# Altium footprint library B-NT_CONNECT.PcbLib: 109 footprints (part 5 of 7)
Each footprint in its own frame and in the unit in brackets; x right, y up, seen from the top. Pads: shape width x height; smd on the part's side, far side on the other; paste and mask are expansions set on the pad; w line width, h text height; cw(c..) or ccw(c..) is an arc to the next point about the centre after c.
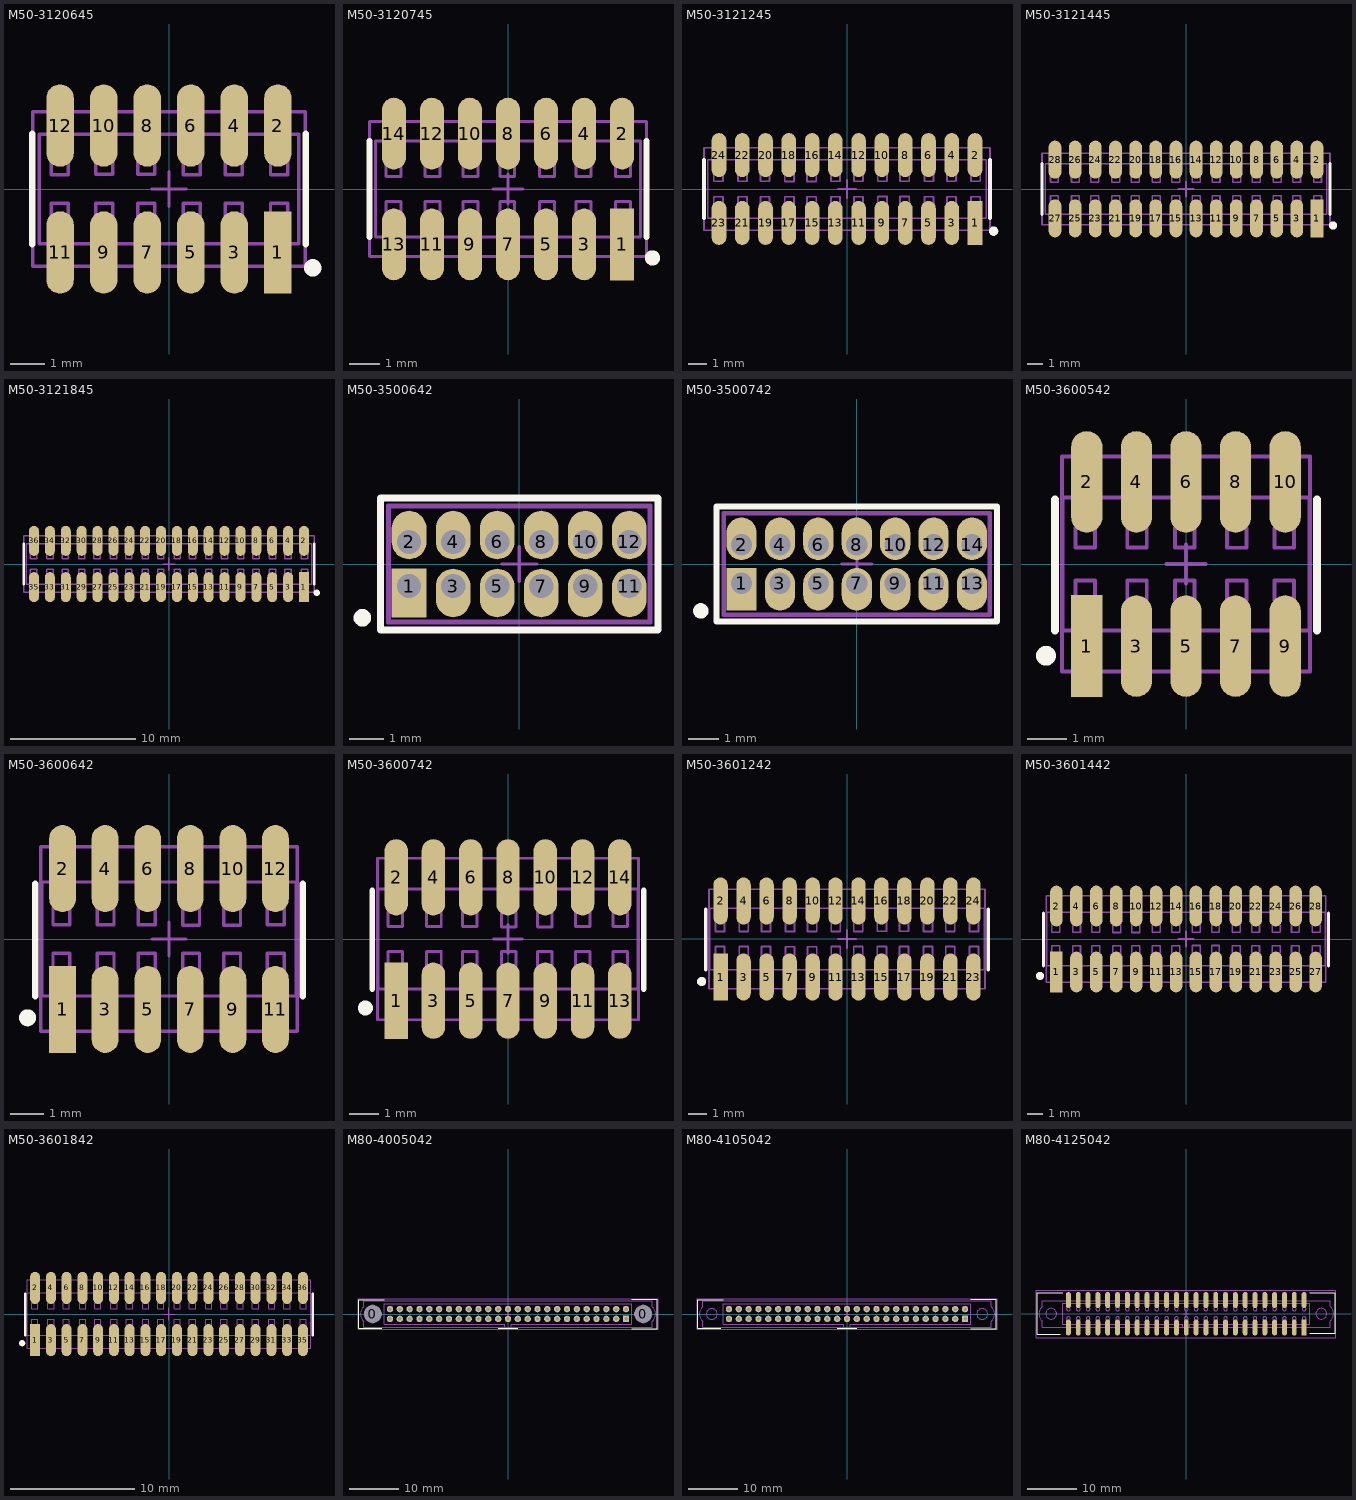
[diagram p4: the footprints below, top view; thin cyan lines are the x and y axes]

## M50-3120645 [mm]
height 3.6
pads (12):
  rect 0.8x2.4 smd: 1(3.175,-1.85)
  oval 0.8x2.4 smd: 2(3.175,1.85) 3(1.905,-1.85) 4(1.905,1.85) 5(0.635,-1.85) 6(0.635,1.85) 7(-0.635,-1.85) 8(-0.635,1.85) 9(-1.905,-1.85) 10(-1.905,1.85) 11(-3.175,-1.85) 12(-3.175,1.85)
Top Overlay:
  circle w0.254: c4.19,-2.3 r0.127
  lines w0.2: -3.99,-1.6 -3.99,1.6 ; 3.99,-1.6 3.99,1.6
M3 Top Assy:
  lines w0.1: -3.375,-1.615 -3.375,-2.37 -2.975,-2.37 -2.975,-1.615 ; -3.375,1.615 -3.375,2.37 -2.975,2.37 -2.975,1.615 ; -2.105,-1.615 -2.105,-2.37 -1.705,-2.37 -1.705,-1.615 ; -2.105,1.615 -2.105,2.37 -1.705,2.37 -1.705,1.615 ; -0.835,-1.615 -0.835,-2.37 -0.435,-2.37 -0.435,-1.615 ; -0.835,1.615 -0.835,2.37 -0.435,2.37 -0.435,1.615 ; 0.435,-1.615 0.435,-2.37 0.835,-2.37 0.835,-1.615 ; 0.435,1.615 0.435,2.37 0.835,2.37 0.835,1.615 ; 1.695,-1.62 1.695,-2.375 2.095,-2.375 2.095,-1.62 ; 1.695,1.62 1.695,2.375 2.095,2.375 2.095,1.62 ; 2.975,-1.615 2.975,-2.37 3.375,-2.37 3.375,-1.615 ; 2.975,1.615 2.975,2.37 3.375,2.37 3.375,1.615 ; -3.79,-1.6 -3.79,1.6 3.79,1.6 3.79,-1.6 -3.79,-1.6 ; -3.435,-0.92 -2.935,-0.92 -2.935,-0.42 -3.435,-0.42 -3.435,-0.92 ; -3.435,0.42 -3.435,0.92 -2.935,0.92 -2.935,0.42 -3.435,0.42 ; -2.135,-0.915 -2.135,-0.415 -1.635,-0.415 -1.635,-0.915 -2.135,-0.915 ; -2.135,0.425 -1.635,0.425 -1.635,0.925 -2.135,0.925 -2.135,0.425 ; -0.91,-0.915 -0.91,-0.415 -0.41,-0.415 -0.41,-0.915 -0.91,-0.915 ; -0.91,0.425 -0.41,0.425 -0.41,0.925 -0.91,0.925 -0.91,0.425 ; 0.415,-0.92 0.415,-0.42 0.915,-0.42 0.915,-0.92 0.415,-0.92 ; 0.415,0.42 0.915,0.42 0.915,0.92 0.415,0.92 0.415,0.42 ; 1.64,-0.92 1.64,-0.42 2.14,-0.42 2.14,-0.92 1.64,-0.92 ; 1.64,0.42 2.14,0.42 2.14,0.92 1.64,0.92 1.64,0.42 ; 2.96,-0.92 2.96,-0.42 3.46,-0.42 3.46,-0.92 2.96,-0.92 ; 2.96,0.42 3.46,0.42 3.46,0.92 2.96,0.92 2.96,0.42
M8 Top Brd Anno:
  lines w0.1: -0.5,0 0.5,0 ; 0,-0.5 0,0.5 ; -3.975,-2.25 3.975,-2.25 3.975,2.25 -3.7,2.25 -3.975,2.25 -3.975,-2.25
3D body "m50-3120645_asm.stp": height 3.5, standoff -0.1, extent -3.985,-2.25 3.985,2.25

## M50-3120745 [mm]
height 3.6
pads (14):
  rect 0.8x2.4 smd: 1(3.81,-1.85)
  oval 0.8x2.4 smd: 2(3.81,1.85) 3(2.54,-1.85) 4(2.54,1.85) 5(1.27,-1.85) 6(1.27,1.85) 7(0,-1.85) 8(0,1.85) 9(-1.27,-1.85) 10(-1.27,1.85) 11(-2.54,-1.85) 12(-2.54,1.85) 13(-3.81,-1.85) 14(-3.81,1.85)
Top Overlay:
  circle w0.254: c4.825,-2.3 r0.127
  lines w0.2: -4.625,-1.6 -4.625,1.6 ; 4.625,-1.6 4.625,1.6
M3 Top Assy:
  lines w0.1: -4.01,-1.615 -4.01,-2.37 -3.61,-2.37 -3.61,-1.615 ; -4.01,1.615 -4.01,2.37 -3.61,2.37 -3.61,1.615 ; -2.74,-1.615 -2.74,-2.37 -2.34,-2.37 -2.34,-1.615 ; -2.74,1.615 -2.74,2.37 -2.34,2.37 -2.34,1.615 ; -1.47,-1.615 -1.47,-2.37 -1.07,-2.37 -1.07,-1.615 ; -1.47,1.615 -1.47,2.37 -1.07,2.37 -1.07,1.615 ; -0.2,-1.615 -0.2,-2.37 0.2,-2.37 0.2,-1.615 ; -0.2,1.615 -0.2,2.37 0.2,2.37 0.2,1.615 ; 1.07,-1.615 1.07,-2.37 1.47,-2.37 1.47,-1.615 ; 1.07,1.615 1.07,2.37 1.47,2.37 1.47,1.615 ; 2.33,-1.62 2.33,-2.375 2.73,-2.375 2.73,-1.62 ; 2.33,1.62 2.33,2.375 2.73,2.375 2.73,1.62 ; 3.61,-1.615 3.61,-2.37 4.01,-2.37 4.01,-1.615 ; 3.61,1.615 3.61,2.37 4.01,2.37 4.01,1.615 ; -4.425,-1.6 4.425,-1.6 4.425,1.6 -4.425,1.6 -4.425,-1.6 ; -4.07,-0.92 -4.07,-0.42 -3.57,-0.42 -3.57,-0.92 -4.07,-0.92 ; -4.07,0.42 -3.57,0.42 -3.57,0.92 -4.07,0.92 -4.07,0.42 ; -2.77,-0.915 -2.77,-0.415 -2.27,-0.415 -2.27,-0.915 -2.77,-0.915 ; -2.77,0.425 -2.27,0.425 -2.27,0.925 -2.77,0.925 -2.77,0.425 ; -1.5,-0.915 -1,-0.915 -1,-0.415 -1.5,-0.415 -1.5,-0.915 ; -1.5,0.425 -1.5,0.925 -1,0.925 -1,0.425 -1.5,0.425 ; -0.275,-0.915 0.225,-0.915 0.225,-0.415 -0.275,-0.415 -0.275,-0.915 ; -0.275,0.425 -0.275,0.925 0.225,0.925 0.225,0.425 -0.275,0.425 ; 1.05,-0.92 1.55,-0.92 1.55,-0.42 1.05,-0.42 1.05,-0.92 ; 1.05,0.42 1.05,0.92 1.55,0.92 1.55,0.42 1.05,0.42 ; 2.275,-0.92 2.775,-0.92 2.775,-0.42 2.275,-0.42 2.275,-0.92 ; 2.275,0.42 2.275,0.92 2.775,0.92 2.775,0.42 2.275,0.42 ; 3.595,-0.92 4.095,-0.92 4.095,-0.42 3.595,-0.42 3.595,-0.92 ; 3.595,0.42 3.595,0.92 4.095,0.92 4.095,0.42 3.595,0.42
M8 Top Brd Anno:
  lines w0.1: -0.5,0 0.5,0 ; 0,-0.5 0,0.5 ; -4.625,-2.25 4.625,-2.25 4.625,2.25 -4.625,2.25 -4.625,-2.25
3D body "m50-3120745_asm.stp": height 3.5, standoff -0.1, extent -4.62,-2.25 4.62,2.25

## M50-3121245 [mm]
height 3.6
pads (24):
  rect 0.8x2.4 smd: 1(6.985,-1.85)
  oval 0.8x2.4 smd: 2(6.985,1.85) 3(5.715,-1.85) 4(5.715,1.85) 5(4.445,-1.85) 6(4.445,1.85) 7(3.175,-1.85) 8(3.175,1.85) 9(1.905,-1.85) 10(1.905,1.85) 11(0.635,-1.85) 12(0.635,1.85) 13(-0.635,-1.85) 14(-0.635,1.85) 15(-1.905,-1.85) 16(-1.905,1.85) 17(-3.175,-1.85) 18(-3.175,1.85) 19(-4.445,-1.85) 20(-4.445,1.85) 21(-5.715,-1.85) 22(-5.715,1.85) 23(-6.985,-1.85) 24(-6.985,1.85)
Top Overlay:
  circle w0.254: c8,-2.3 r0.127
  lines w0.2: -7.8,-1.6 -7.8,1.6 ; 7.8,-1.6 7.8,1.6
M3 Top Assy:
  drawing of 172 lines, arcs and shapes, not listed
M8 Top Brd Anno:
  lines w0.1: -0.5,0 0.5,0 ; 0,-0.5 0,0.5 ; -7.8,-2.25 7.8,-2.25 7.8,2.25 -7.8,2.25 -7.8,-2.25
3D body "m50-3121245_asm.stp": height 3.5, standoff -0.1, extent -7.795,-2.25 7.795,2.25

## M50-3121445 [mm]
height 3.6
pads (28):
  rect 0.8x2.4 smd: 1(8.255,-1.85)
  oval 0.8x2.4 smd: 2(8.255,1.85) 3(6.985,-1.85) 4(6.985,1.85) 5(5.715,-1.85) 6(5.715,1.85) 7(4.445,-1.85) 8(4.445,1.85) 9(3.175,-1.85) 10(3.175,1.85) 11(1.905,-1.85) 12(1.905,1.85) 13(0.635,-1.85) 14(0.635,1.85) 15(-0.635,-1.85) 16(-0.635,1.85) 17(-1.905,-1.85) 18(-1.905,1.85) 19(-3.175,-1.85) 20(-3.175,1.85) 21(-4.445,-1.85) 22(-4.445,1.85) 23(-5.715,-1.85) 24(-5.715,1.85) 25(-6.985,-1.85) 26(-6.985,1.85) 27(-8.255,-1.85) 28(-8.255,1.85)
Top Overlay:
  circle w0.254: c9.27,-2.3 r0.127
  lines w0.2: -9.07,-1.6 -9.07,1.6 ; 9.07,-1.6 9.07,1.6
M3 Top Assy:
  drawing of 200 lines, arcs and shapes, not listed
M8 Top Brd Anno:
  lines w0.1: -0.5,0 0.5,0 ; 0,-0.5 0,0.5 ; -9.075,-2.25 9.075,-2.25 9.075,2.25 -9.075,2.25 -9.075,-2.25
3D body "m50-3121445_asm.stp": height 3.5, standoff -0.1, extent -9.065,-2.25 9.065,2.25

## M50-3121845 [mm]
height 3.6
pads (36):
  rect 0.8x2.4 smd: 1(10.795,-1.85)
  oval 0.8x2.4 smd: 2(10.795,1.85) 3(9.525,-1.85) 4(9.525,1.85) 5(8.255,-1.85) 6(8.255,1.85) 7(6.985,-1.85) 8(6.985,1.85) 9(5.715,-1.85) 10(5.715,1.85) 11(4.445,-1.85) 12(4.445,1.85) 13(3.175,-1.85) 14(3.175,1.85) 15(1.905,-1.85) 16(1.905,1.85) 17(0.635,-1.85) 18(0.635,1.85) 19(-0.635,-1.85) 20(-0.635,1.85) 21(-1.905,-1.85) 22(-1.905,1.85) 23(-3.175,-1.85) 24(-3.175,1.85) 25(-4.445,-1.85) 26(-4.445,1.85) 27(-5.715,-1.85) 28(-5.715,1.85) 29(-6.985,-1.85) 30(-6.985,1.85) 31(-8.255,-1.85) 32(-8.255,1.85) 33(-9.525,-1.85) 34(-9.525,1.85) 35(-10.795,-1.85) 36(-10.795,1.85)
Top Overlay:
  circle w0.254: c11.81,-2.3 r0.127
  lines w0.2: -11.61,-1.6 -11.61,1.6 ; 11.61,-1.6 11.61,1.6
M3 Top Assy:
  drawing of 256 lines, arcs and shapes, not listed
M8 Top Brd Anno:
  lines w0.1: -0.5,0 0.5,0 ; 0,-0.5 0,0.5 ; -11.6,-2.25 11.6,-2.25 11.6,2.25 -11.6,2.25 -11.6,-2.25
3D body "m50-3121845_asm.stp": height 3.5, standoff -0.1, extent -11.605,-2.25 11.605,2.25

## M50-3500642 [mm]
pads (12):
  rect 1x1.4 hole 0.7 copper offset 0,-0.2: 1(-3.175,-0.635)
  oval 1x1.4 hole 0.7 copper offset 0,0.2: 2(-3.175,0.635) 4(-1.905,0.635) 6(-0.635,0.635) 8(0.635,0.635) 10(1.905,0.635) 12(3.175,0.635)
  oval 1x1.4 hole 0.7 copper offset 0,-0.2: 3(-1.905,-0.635) 5(-0.635,-0.635) 7(0.635,-0.635) 9(1.905,-0.635) 11(3.175,-0.635)
Top Overlay:
  circle w0.254: c-4.52,-1.55 r0.127
  lines w0.2: -4,-1.9 4,-1.9 4,1.9 -4,1.9 -4,-1.9
M3 Top Assy:
  lines w0.1: -3.79,-1.7 -3.79,1.7 3.79,1.7 3.79,-1.7 -3.79,-1.7 ; -3.46,-0.92 -2.96,-0.92 -2.96,-0.42 -3.46,-0.42 -3.46,-0.92 ; -3.46,0.42 -3.46,0.92 -2.96,0.92 -2.96,0.42 -3.46,0.42 ; -2.14,-0.92 -1.64,-0.92 -1.64,-0.42 -2.14,-0.42 -2.14,-0.92 ; -2.14,0.42 -2.14,0.92 -1.64,0.92 -1.64,0.42 -2.14,0.42 ; -0.915,-0.92 -0.415,-0.92 -0.415,-0.42 -0.915,-0.42 -0.915,-0.92 ; -0.915,0.42 -0.915,0.92 -0.415,0.92 -0.415,0.42 -0.915,0.42 ; 0.41,-0.925 0.91,-0.925 0.91,-0.425 0.41,-0.425 0.41,-0.925 ; 0.41,0.415 0.41,0.915 0.91,0.915 0.91,0.415 0.41,0.415 ; 1.635,-0.925 2.135,-0.925 2.135,-0.425 1.635,-0.425 1.635,-0.925 ; 1.635,0.415 1.635,0.915 2.135,0.915 2.135,0.415 1.635,0.415 ; 2.935,-0.92 2.935,-0.42 3.435,-0.42 3.435,-0.92 2.935,-0.92 ; 2.935,0.42 3.435,0.42 3.435,0.92 2.935,0.92 2.935,0.42
M8 Top Brd Anno:
  lines w0.1: -3.75,1.625 -3.725,1.65 3.75,1.65 3.75,-1.65 -3.75,-1.65 -3.75,1.65 ; -0.5,0 0.5,0 ; 0,-0.5 0,0.5
3D body "m50-3500642_asm.stp": height 3.97, standoff -2.33, extent -3.81,-1.7 3.81,1.7

## M50-3500742 [mm]
pads (14):
  rect 1x1.4 hole 0.7 copper offset 0,-0.2: 1(-3.81,-0.635)
  oval 1x1.4 hole 0.7 copper offset 0,0.2: 2(-3.81,0.635) 4(-2.54,0.635) 6(-1.27,0.635) 8(0,0.635) 10(1.27,0.635) 12(2.54,0.635) 14(3.81,0.635)
  oval 1x1.4 hole 0.7 copper offset 0,-0.2: 3(-2.54,-0.635) 5(-1.27,-0.635) 7(0,-0.635) 9(1.27,-0.635) 11(2.54,-0.635) 13(3.81,-0.635)
Top Overlay:
  circle w0.254: c-5.155,-1.55 r0.127
  lines w0.2: -4.635,-1.9 4.635,-1.9 4.635,1.9 -4.635,1.9 -4.635,-1.9
M3 Top Assy:
  lines w0.1: -4.425,-1.7 -4.425,1.7 4.425,1.7 4.425,-1.7 -4.425,-1.7 ; -4.095,-0.92 -3.595,-0.92 -3.595,-0.42 -4.095,-0.42 -4.095,-0.92 ; -4.095,0.42 -4.095,0.92 -3.595,0.92 -3.595,0.42 -4.095,0.42 ; -2.775,-0.92 -2.275,-0.92 -2.275,-0.42 -2.775,-0.42 -2.775,-0.92 ; -2.775,0.42 -2.775,0.92 -2.275,0.92 -2.275,0.42 -2.775,0.42 ; -1.55,-0.92 -1.05,-0.92 -1.05,-0.42 -1.55,-0.42 -1.55,-0.92 ; -1.55,0.42 -1.55,0.92 -1.05,0.92 -1.05,0.42 -1.55,0.42 ; -0.225,-0.925 0.275,-0.925 0.275,-0.425 -0.225,-0.425 -0.225,-0.925 ; -0.225,0.415 -0.225,0.915 0.275,0.915 0.275,0.415 -0.225,0.415 ; 1,-0.925 1.5,-0.925 1.5,-0.425 1,-0.425 1,-0.925 ; 1,0.415 1,0.915 1.5,0.915 1.5,0.415 1,0.415 ; 2.27,-0.925 2.27,-0.425 2.77,-0.425 2.77,-0.925 2.27,-0.925 ; 2.27,0.415 2.77,0.415 2.77,0.915 2.27,0.915 2.27,0.415 ; 3.57,-0.92 3.57,-0.42 4.07,-0.42 4.07,-0.92 3.57,-0.92 ; 3.57,0.42 4.07,0.42 4.07,0.92 3.57,0.92 3.57,0.42
M8 Top Brd Anno:
  lines w0.1: -0.5,0 0.5,0 ; 0,-0.5 0,0.5 ; -4.375,-1.65 4.375,-1.65 4.375,1.65 -4.375,1.65 -4.375,-1.65
3D body "m50-3500742_asm.stp": height 3.97, standoff -2.33, extent -4.445,-1.7 4.445,1.7

## M50-3600542 [mm]
pads (10):
  rect 0.8x2.6 smd: 1(-2.54,-2.1)
  oval 0.8x2.6 smd: 2(-2.54,2.1) 3(-1.27,-2.1) 4(-1.27,2.1) 5(0,-2.1) 6(0,2.1) 7(1.27,-2.1) 8(1.27,2.1) 9(2.54,-2.1) 10(2.54,2.1)
Top Overlay:
  circle w0.254: c-3.585,-2.35 r0.127
  lines w0.2: -3.355,-1.7 -3.355,1.65 ; 3.355,-1.7 3.355,1.65
M3 Top Assy:
  lines w0.1: -2.74,-1.715 -2.74,-2.47 -2.34,-2.47 -2.34,-1.715 ; -2.74,1.715 -2.74,2.47 -2.34,2.47 -2.34,1.715 ; -1.47,-1.715 -1.47,-2.47 -1.07,-2.47 -1.07,-1.715 ; -1.47,1.715 -1.47,2.47 -1.07,2.47 -1.07,1.715 ; -0.2,-1.715 -0.2,-2.47 0.2,-2.47 0.2,-1.715 ; -0.2,1.715 -0.2,2.47 0.2,2.47 0.2,1.715 ; 1.06,-1.72 1.06,-2.475 1.46,-2.475 1.46,-1.72 ; 1.06,1.72 1.06,2.475 1.46,2.475 1.46,1.72 ; 2.34,-1.715 2.34,-2.47 2.74,-2.47 2.74,-1.715 ; 2.34,1.715 2.34,2.47 2.74,2.47 2.74,1.715 ; -3.155,-1.7 3.155,-1.7 3.155,1.7 -3.155,1.7 -3.155,-1.7 ; -2.825,-0.92 -2.825,-0.42 -2.325,-0.42 -2.325,-0.92 -2.825,-0.92 ; -2.825,0.42 -2.325,0.42 -2.325,0.92 -2.825,0.92 -2.825,0.42 ; -1.505,-0.92 -1.505,-0.42 -1.005,-0.42 -1.005,-0.92 -1.505,-0.92 ; -1.505,0.42 -1.005,0.42 -1.005,0.92 -1.505,0.92 -1.505,0.42 ; -0.28,-0.92 -0.28,-0.42 0.22,-0.42 0.22,-0.92 -0.28,-0.92 ; -0.28,0.42 0.22,0.42 0.22,0.92 -0.28,0.92 -0.28,0.42 ; 1.045,-0.925 1.045,-0.425 1.545,-0.425 1.545,-0.925 1.045,-0.925 ; 1.045,0.415 1.545,0.415 1.545,0.915 1.045,0.915 1.045,0.415 ; 2.27,-0.925 2.27,-0.425 2.77,-0.425 2.77,-0.925 2.27,-0.925 ; 2.27,0.415 2.77,0.415 2.77,0.915 2.27,0.915 2.27,0.415
M8 Top Brd Anno:
  lines w0.1: -0.5,0 0.5,0 ; 0,-0.5 0,0.5 ; -3.175,-2.75 3.175,-2.75 3.175,2.75 -3.175,2.75 -3.175,-2.75
3D body "m50-3600542_asm.stp": height 4.6, standoff -0.08, extent -3.175,-2.75 3.175,2.75

## M50-3600642 [mm]
pads (12):
  rect 0.8x2.6 smd: 1(-3.175,-2.1)
  oval 0.8x2.6 smd: 2(-3.175,2.1) 3(-1.905,-2.1) 4(-1.905,2.1) 5(-0.635,-2.1) 6(-0.635,2.1) 7(0.635,-2.1) 8(0.635,2.1) 9(1.905,-2.1) 10(1.905,2.1) 11(3.175,-2.1) 12(3.175,2.1)
Top Overlay:
  circle w0.254: c-4.22,-2.35 r0.127
  lines w0.2: -3.99,-1.7 -3.99,1.65 ; 3.99,-1.7 3.99,1.65
M3 Top Assy:
  lines w0.1: -3.375,-1.715 -3.375,-2.47 -2.975,-2.47 -2.975,-1.715 ; -3.375,1.715 -3.375,2.47 -2.975,2.47 -2.975,1.715 ; -2.105,-1.715 -2.105,-2.47 -1.705,-2.47 -1.705,-1.715 ; -2.105,1.715 -2.105,2.47 -1.705,2.47 -1.705,1.715 ; -0.835,-1.715 -0.835,-2.47 -0.435,-2.47 -0.435,-1.715 ; -0.835,1.715 -0.835,2.47 -0.435,2.47 -0.435,1.715 ; 0.425,-1.72 0.425,-2.475 0.825,-2.475 0.825,-1.72 ; 0.425,1.72 0.425,2.475 0.825,2.475 0.825,1.72 ; 1.705,-1.715 1.705,-2.47 2.105,-2.47 2.105,-1.715 ; 1.705,1.715 1.705,2.47 2.105,2.47 2.105,1.715 ; 2.975,-1.715 2.975,-2.47 3.375,-2.47 3.375,-1.715 ; 2.975,1.715 2.975,2.47 3.375,2.47 3.375,1.715 ; -3.79,-1.7 3.79,-1.7 3.79,1.7 -3.79,1.7 -3.79,-1.7 ; -3.46,-0.92 -3.46,-0.42 -2.96,-0.42 -2.96,-0.92 -3.46,-0.92 ; -3.46,0.42 -2.96,0.42 -2.96,0.92 -3.46,0.92 -3.46,0.42 ; -2.14,-0.92 -2.14,-0.42 -1.64,-0.42 -1.64,-0.92 -2.14,-0.92 ; -2.14,0.42 -1.64,0.42 -1.64,0.92 -2.14,0.92 -2.14,0.42 ; -0.915,-0.92 -0.915,-0.42 -0.415,-0.42 -0.415,-0.92 -0.915,-0.92 ; -0.915,0.42 -0.415,0.42 -0.415,0.92 -0.915,0.92 -0.915,0.42 ; 0.41,-0.925 0.41,-0.425 0.91,-0.425 0.91,-0.925 0.41,-0.925 ; 0.41,0.415 0.91,0.415 0.91,0.915 0.41,0.915 0.41,0.415 ; 1.635,-0.925 1.635,-0.425 2.135,-0.425 2.135,-0.925 1.635,-0.925 ; 1.635,0.415 2.135,0.415 2.135,0.915 1.635,0.915 1.635,0.415 ; 2.935,-0.92 3.435,-0.92 3.435,-0.42 2.935,-0.42 2.935,-0.92 ; 2.935,0.42 2.935,0.92 3.435,0.92 3.435,0.42 2.935,0.42
M8 Top Brd Anno:
  lines w0.1: -0.5,0 0.5,0 ; 0,-0.5 0,0.5 ; -3.825,-2.75 3.825,-2.75 3.825,2.75 -3.825,2.75 -3.825,-2.75
3D body "m50-3600642_asm.stp": height 4.6, standoff -0.08, extent -3.81,-2.75 3.81,2.75

## M50-3600742 [mm]
pads (14):
  rect 0.8x2.6 smd: 1(-3.81,-2.1)
  oval 0.8x2.6 smd: 2(-3.81,2.1) 3(-2.54,-2.1) 4(-2.54,2.1) 5(-1.27,-2.1) 6(-1.27,2.1) 7(0,-2.1) 8(0,2.1) 9(1.27,-2.1) 10(1.27,2.1) 11(2.54,-2.1) 12(2.54,2.1) 13(3.81,-2.1) 14(3.81,2.1)
Top Overlay:
  circle w0.254: c-4.855,-2.35 r0.127
  lines w0.2: -4.625,-1.7 -4.625,1.65 ; 4.625,-1.7 4.625,1.65
M3 Top Assy:
  lines w0.1: -4.01,-1.715 -4.01,-2.47 -3.61,-2.47 -3.61,-1.715 ; -4.01,1.715 -4.01,2.47 -3.61,2.47 -3.61,1.715 ; -2.74,-1.715 -2.74,-2.47 -2.34,-2.47 -2.34,-1.715 ; -2.74,1.715 -2.74,2.47 -2.34,2.47 -2.34,1.715 ; -1.47,-1.715 -1.47,-2.47 -1.07,-2.47 -1.07,-1.715 ; -1.47,1.715 -1.47,2.47 -1.07,2.47 -1.07,1.715 ; -0.21,-1.72 -0.21,-2.475 0.19,-2.475 0.19,-1.72 ; -0.21,1.72 -0.21,2.475 0.19,2.475 0.19,1.72 ; 1.07,-1.715 1.07,-2.47 1.47,-2.47 1.47,-1.715 ; 1.07,1.715 1.07,2.47 1.47,2.47 1.47,1.715 ; 2.34,-1.715 2.34,-2.47 2.74,-2.47 2.74,-1.715 ; 2.34,1.715 2.34,2.47 2.74,2.47 2.74,1.715 ; 3.61,-1.715 3.61,-2.47 4.01,-2.47 4.01,-1.715 ; 3.61,1.715 3.61,2.47 4.01,2.47 4.01,1.715 ; -4.425,-1.7 4.425,-1.7 4.425,1.7 -4.425,1.7 -4.425,-1.7 ; -4.095,-0.92 -4.095,-0.42 -3.595,-0.42 -3.595,-0.92 -4.095,-0.92 ; -4.095,0.42 -3.595,0.42 -3.595,0.92 -4.095,0.92 -4.095,0.42 ; -2.775,-0.92 -2.775,-0.42 -2.275,-0.42 -2.275,-0.92 -2.775,-0.92 ; -2.775,0.42 -2.275,0.42 -2.275,0.92 -2.775,0.92 -2.775,0.42 ; -1.55,-0.92 -1.55,-0.42 -1.05,-0.42 -1.05,-0.92 -1.55,-0.92 ; -1.55,0.42 -1.05,0.42 -1.05,0.92 -1.55,0.92 -1.55,0.42 ; -0.225,-0.925 -0.225,-0.425 0.275,-0.425 0.275,-0.925 -0.225,-0.925 ; -0.225,0.415 0.275,0.415 0.275,0.915 -0.225,0.915 -0.225,0.415 ; 1,-0.925 1,-0.425 1.5,-0.425 1.5,-0.925 1,-0.925 ; 1,0.415 1.5,0.415 1.5,0.915 1,0.915 1,0.415 ; 2.3,-0.92 2.8,-0.92 2.8,-0.42 2.3,-0.42 2.3,-0.92 ; 2.3,0.42 2.3,0.92 2.8,0.92 2.8,0.42 2.3,0.42 ; 3.57,-0.92 3.57,-0.42 4.07,-0.42 4.07,-0.92 3.57,-0.92 ; 3.57,0.42 4.07,0.42 4.07,0.92 3.57,0.92 3.57,0.42
M8 Top Brd Anno:
  lines w0.1: -0.5,0 0.5,0 ; 0,-0.5 0,0.5 ; -4.45,-2.75 4.45,-2.75 4.45,2.75 -4.45,2.75 -4.45,-2.75
3D body "m50-3600742_asm.stp": height 4.6, standoff -0.08, extent -4.445,-2.75 4.445,2.75

## M50-3601242 [mm]
pads (24):
  rect 0.8x2.6 smd: 1(-6.985,-2.1)
  oval 0.8x2.6 smd: 2(-6.985,2.1) 3(-5.715,-2.1) 4(-5.715,2.1) 5(-4.445,-2.1) 6(-4.445,2.1) 7(-3.175,-2.1) 8(-3.175,2.1) 9(-1.905,-2.1) 10(-1.905,2.1) 11(-0.635,-2.1) 12(-0.635,2.1) 13(0.635,-2.1) 14(0.635,2.1) 15(1.905,-2.1) 16(1.905,2.1) 17(3.175,-2.1) 18(3.175,2.1) 19(4.445,-2.1) 20(4.445,2.1) 21(5.715,-2.1) 22(5.715,2.1) 23(6.985,-2.1) 24(6.985,2.1)
Top Overlay:
  circle w0.254: c-8.03,-2.35 r0.127
  lines w0.2: -7.8,-1.7 -7.8,1.65 ; 7.8,-1.7 7.8,1.65
M3 Top Assy:
  drawing of 172 lines, arcs and shapes, not listed
M8 Top Brd Anno:
  lines w0.1: -0.5,0 0.5,0 ; 0,-0.5 0,0.5 ; -7.625,-2.75 7.625,-2.75 7.625,2.75 -7.625,2.75 -7.625,-2.75
3D body "m50-3601242_asm.stp": height 4.6, standoff -0.08, extent -7.62,-2.75 7.62,2.75

## M50-3601442 [mm]
pads (28):
  rect 0.8x2.6 smd: 1(-8.255,-2.1)
  oval 0.8x2.6 smd: 2(-8.255,2.1) 3(-6.985,-2.1) 4(-6.985,2.1) 5(-5.715,-2.1) 6(-5.715,2.1) 7(-4.445,-2.1) 8(-4.445,2.1) 9(-3.175,-2.1) 10(-3.175,2.1) 11(-1.905,-2.1) 12(-1.905,2.1) 13(-0.635,-2.1) 14(-0.635,2.1) 15(0.635,-2.1) 16(0.635,2.1) 17(1.905,-2.1) 18(1.905,2.1) 19(3.175,-2.1) 20(3.175,2.1) 21(4.445,-2.1) 22(4.445,2.1) 23(5.715,-2.1) 24(5.715,2.1) 25(6.985,-2.1) 26(6.985,2.1) 27(8.255,-2.1) 28(8.255,2.1)
Top Overlay:
  circle w0.254: c-9.3,-2.35 r0.127
  lines w0.2: -9.07,-1.7 -9.07,1.65 ; 9.07,-1.7 9.07,1.65
M3 Top Assy:
  drawing of 200 lines, arcs and shapes, not listed
M8 Top Brd Anno:
  lines w0.1: -0.5,0 0.5,0 ; 0,-0.5 0,0.5 ; -8.9,-2.75 8.9,-2.75 8.9,2.75 -8.9,2.75 -8.9,-2.75
3D body "m50-3601442_asm.stp": height 4.6, standoff -0.08, extent -8.89,-2.75 8.89,2.75

## M50-3601842 [mm]
pads (36):
  rect 0.8x2.6 smd: 1(-10.795,-2.1)
  oval 0.8x2.6 smd: 2(-10.795,2.1) 3(-9.525,-2.1) 4(-9.525,2.1) 5(-8.255,-2.1) 6(-8.255,2.1) 7(-6.985,-2.1) 8(-6.985,2.1) 9(-5.715,-2.1) 10(-5.715,2.1) 11(-4.445,-2.1) 12(-4.445,2.1) 13(-3.175,-2.1) 14(-3.175,2.1) 15(-1.905,-2.1) 16(-1.905,2.1) 17(-0.635,-2.1) 18(-0.635,2.1) 19(0.635,-2.1) 20(0.635,2.1) 21(1.905,-2.1) 22(1.905,2.1) 23(3.175,-2.1) 24(3.175,2.1) 25(4.445,-2.1) 26(4.445,2.1) 27(5.715,-2.1) 28(5.715,2.1) 29(6.985,-2.1) 30(6.985,2.1) 31(8.255,-2.1) 32(8.255,2.1) 33(9.525,-2.1) 34(9.525,2.1) 35(10.795,-2.1) 36(10.795,2.1)
Top Overlay:
  circle w0.254: c-11.84,-2.35 r0.127
  lines w0.2: -11.61,-1.7 -11.61,1.65 ; 11.61,-1.7 11.61,1.65
M3 Top Assy:
  drawing of 256 lines, arcs and shapes, not listed
M8 Top Brd Anno:
  lines w0.1: -0.5,0 0.5,0 ; 0,-0.5 0,0.5 ; -11.425,-2.75 11.425,-2.75 11.425,2.75 -11.425,2.75 -11.425,-2.75
3D body "m50-3601842_asm.stp": height 4.6, standoff -0.08, extent -11.43,-2.75 11.43,2.75

## M80-4005042 [mm] "25+25 WAY FEMALE PC TAIL 3MM"
height 5.2
pads (52):
  round 3.5 hole 3.5 unplated: 0(-27.5,0) 0(27.5,0)
  rect 1.3x1.3 hole 0.7: 1(24,-1)
  round 1.3 hole 0.7: 2(22,-1) 3(20,-1) 4(18,-1) 5(16,-1) 6(14,-1) 7(12,-1) 8(10,-1) 9(8,-1) 10(6,-1) 11(4,-1) 12(2,-1) 13(0,-1) 14(-2,-1) 15(-4,-1) 16(-6,-1) 17(-8,-1) 18(-10,-1) 19(-12,-1) 20(-14,-1) 21(-16,-1) 22(-18,-1) 23(-20,-1) 24(-22,-1) 25(-24,-1) 26(24,1) 27(22,1) 28(20,1) 29(18,1) 30(16,1) 31(14,1) 32(12,1) 33(10,1) 34(8,1) 35(6,1) 36(4,1) 37(2,1) 38(0,1) 39(-2,1) 40(-4,1) 41(-6,1) 42(-8,1) 43(-10,1) 44(-12,1) 45(-14,1) 46(-16,1) 47(-18,1) 48(-20,1) 49(-22,1) 50(-24,1)
Top Overlay:
  lines w0.2: -25.7,-2.9 -30.3,-2.9 -30.3,2.9 -25.2,2.9 ; -2,-2.9 2,-2.9 ; 25.2,-3 30.3,-3 30.3,3 25.2,3
M3 Top Assy:
  circle w0.1: c27.5,0 r1.75
  circle w0.1: c27.5,0 r1.1
  circle w0.1: c-24,-1 r0.4
  circle w0.1: c-22,-1 r0.4
  circle w0.1: c-18,-1 r0.4
  circle w0.1: c-20,-1 r0.4
  circle w0.1: c-12,-1 r0.4
  circle w0.1: c-10,-1 r0.4
  circle w0.1: c-14,-1 r0.4
  circle w0.1: c-16,-1 r0.4
  circle w0.1: c0,-1 r0.4
  circle w0.1: c2,-1 r0.4
  circle w0.1: c6,-1 r0.4
  circle w0.1: c4,-1 r0.4
  circle w0.1: c-4,-1 r0.4
  circle w0.1: c-2,-1 r0.4
  circle w0.1: c-6,-1 r0.4
  circle w0.1: c-8,-1 r0.4
  circle w0.1: c12,-1 r0.4
  circle w0.1: c14,-1 r0.4
  circle w0.1: c10,-1 r0.4
  circle w0.1: c8,-1 r0.4
  circle w0.1: c8,1 r0.4
  circle w0.1: c10,1 r0.4
  circle w0.1: c14,1 r0.4
  circle w0.1: c12,1 r0.4
  circle w0.1: c-8,1 r0.4
  circle w0.1: c-6,1 r0.4
  circle w0.1: c-2,1 r0.4
  circle w0.1: c-4,1 r0.4
  circle w0.1: c4,1 r0.4
  circle w0.1: c6,1 r0.4
  circle w0.1: c2,1 r0.4
  circle w0.1: c0,1 r0.4
  circle w0.1: c-16,1 r0.4
  circle w0.1: c-14,1 r0.4
  circle w0.1: c-10,1 r0.4
  circle w0.1: c-12,1 r0.4
  circle w0.1: c-20,1 r0.4
  circle w0.1: c-18,1 r0.4
  circle w0.1: c-22,1 r0.4
  circle w0.1: c-24,1 r0.4
  circle w0.1: c16,1 r0.4
  circle w0.1: c22,1 r0.4
  circle w0.1: c24,1 r0.4
  circle w0.1: c20,1 r0.4
  circle w0.1: c18,1 r0.4
  circle w0.1: c18,-1 r0.4
  circle w0.1: c20,-1 r0.4
  circle w0.1: c24,-1 r0.4
  circle w0.1: c22,-1 r0.4
  circle w0.1: c16,-1 r0.4
  circle w0.1: c-27.5,0 r1.75
  lines w0.1: -29.307,1.505 ccw(c-28.032,0) -29.3,-1.511 ; -29.3,-2.675 -29.3,-1.5 ; -29.3,-1.625 -29.3,-2.7 29.3,-2.7 29.3,-1.5 ; -29.3,2.6 -29.3,1.5 -29.3,2.675 29.3,2.675 29.3,1.5 ; -0.7,-2.7 -0.7,-2.1 -25.2,-2.1 -25.2,2.1 25.2,2.1 25.2,-2.1 0.7,-2.1 0.7,-2.7 ; 29.3,1.511 cw(c28.032,0) 29.307,-1.505
M8 Top Brd Anno:
  lines w0.1: -0.6,0 0.6,0 ; 0,-0.6 0,0.6 ; -30.5,-3.1 -30.5,3.1 30.5,3.1 30.5,-3.1 -30.5,-3.1
3D body "m80-4005042_asm.stp": height 5.5, standoff -3, extent -30,-2.775 30,2.775

## M80-4105042 [mm] "DIL FEMALE VERT PC TAIL CONN"
height 5.2
pads (50):
  rect 1.3x1.3 hole 0.7: 1(24,-1)
  round 1.3 hole 0.7: 2(22,-1) 3(20,-1) 4(18,-1) 5(16,-1) 6(14,-1) 7(12,-1) 8(10,-1) 9(8,-1) 10(6,-1) 11(4,-1) 12(2,-1) 13(0,-1) 14(-2,-1) 15(-4,-1) 16(-6,-1) 17(-8,-1) 18(-10,-1) 19(-12,-1) 20(-14,-1) 21(-16,-1) 22(-18,-1) 23(-20,-1) 24(-22,-1) 25(-24,-1) 26(24,1) 27(22,1) 28(20,1) 29(18,1) 30(16,1) 31(14,1) 32(12,1) 33(10,1) 34(8,1) 35(6,1) 36(4,1) 37(2,1) 38(0,1) 39(-2,1) 40(-4,1) 41(-6,1) 42(-8,1) 43(-10,1) 44(-12,1) 45(-14,1) 46(-16,1) 47(-18,1) 48(-20,1) 49(-22,1) 50(-24,1)
Top Overlay:
  lines w0.2: -25.7,-2.9 -30.3,-2.9 -30.3,2.9 -25.2,2.9 ; -2,-2.9 2,-2.9 ; 25.2,-3 30.3,-3 30.3,3 25.2,3
M3 Top Assy:
  circle w0.1: c-27.5,0 r1.1
  circle w0.1: c27.5,0 r1.1
  circle w0.1: c-24,-1 r0.4
  circle w0.1: c-22,-1 r0.4
  circle w0.1: c-18,-1 r0.4
  circle w0.1: c-20,-1 r0.4
  circle w0.1: c-12,-1 r0.4
  circle w0.1: c-10,-1 r0.4
  circle w0.1: c-14,-1 r0.4
  circle w0.1: c-16,-1 r0.4
  circle w0.1: c0,-1 r0.4
  circle w0.1: c2,-1 r0.4
  circle w0.1: c6,-1 r0.4
  circle w0.1: c4,-1 r0.4
  circle w0.1: c-4,-1 r0.4
  circle w0.1: c-2,-1 r0.4
  circle w0.1: c-6,-1 r0.4
  circle w0.1: c-8,-1 r0.4
  circle w0.1: c12,-1 r0.4
  circle w0.1: c14,-1 r0.4
  circle w0.1: c10,-1 r0.4
  circle w0.1: c8,-1 r0.4
  circle w0.1: c8,1 r0.4
  circle w0.1: c10,1 r0.4
  circle w0.1: c14,1 r0.4
  circle w0.1: c12,1 r0.4
  circle w0.1: c-8,1 r0.4
  circle w0.1: c-6,1 r0.4
  circle w0.1: c-2,1 r0.4
  circle w0.1: c-4,1 r0.4
  circle w0.1: c4,1 r0.4
  circle w0.1: c6,1 r0.4
  circle w0.1: c2,1 r0.4
  circle w0.1: c0,1 r0.4
  circle w0.1: c-16,1 r0.4
  circle w0.1: c-14,1 r0.4
  circle w0.1: c-10,1 r0.4
  circle w0.1: c-12,1 r0.4
  circle w0.1: c-20,1 r0.4
  circle w0.1: c-18,1 r0.4
  circle w0.1: c-22,1 r0.4
  circle w0.1: c-24,1 r0.4
  circle w0.1: c16,1 r0.4
  circle w0.1: c22,1 r0.4
  circle w0.1: c24,1 r0.4
  circle w0.1: c20,1 r0.4
  circle w0.1: c18,1 r0.4
  circle w0.1: c18,-1 r0.4
  circle w0.1: c20,-1 r0.4
  circle w0.1: c24,-1 r0.4
  circle w0.1: c22,-1 r0.4
  circle w0.1: c16,-1 r0.4
  lines w0.1: -29.307,1.505 ccw(c-28.032,0) -29.3,-1.511 ; -29.3,-2.675 -29.3,-1.5 ; -29.3,-1.625 -29.3,-2.7 29.3,-2.7 29.3,-1.5 ; -29.3,2.6 -29.3,1.5 -29.3,2.675 29.3,2.675 29.3,1.5 ; -0.7,-2.7 -0.7,-2.1 -25.2,-2.1 -25.2,2.1 25.2,2.1 25.2,-2.1 0.7,-2.1 0.7,-2.7 ; 29.3,1.511 cw(c28.032,0) 29.307,-1.505
M8 Top Brd Anno:
  lines w0.1: -0.6,0 0.6,0 ; 0,-0.6 0,0.6 ; -30.5,-3.1 -30.5,3.1 30.5,3.1 30.5,-3.1 -30.5,-3.1
3D body "m80-4105042_asm.stp": height 5.2, standoff -2.95, extent -30,-2.775 30,2.775

## M80-4125042 [mm] "25+25 WAY FEMALE SMT + WO J/S"
height 5.6
pads (50):
  rect 1x3.25 smd: 1(24,-2.8)
  oval 1x3.25 smd: 2(22,-2.8) 3(20,-2.8) 4(18,-2.8) 5(16,-2.8) 6(14,-2.8) 7(12,-2.8) 8(10,-2.8) 9(8,-2.8) 10(6,-2.8) 11(4,-2.8) 12(2,-2.8) 13(0,-2.8) 14(-2,-2.8) 15(-4,-2.8) 16(-6,-2.8) 17(-8,-2.8) 18(-10,-2.8) 19(-12,-2.8) 20(-14,-2.8) 21(-16,-2.8) 22(-18,-2.8) 23(-20,-2.8) 24(-22,-2.8) 25(-24,-2.8) 26(24,2.8) 27(22,2.8) 28(20,2.8) 29(18,2.8) 30(16,2.8) 31(14,2.8) 32(12,2.8) 33(10,2.8) 34(8,2.8) 35(6,2.8) 36(4,2.8) 37(2,2.8) 38(0,2.8) 39(-2,2.8) 40(-4,2.8) 41(-6,2.8) 42(-8,2.8) 43(-10,2.8) 44(-12,2.8) 45(-14,2.8) 46(-16,2.8) 47(-18,2.8) 48(-20,2.8) 49(-22,2.8) 50(-24,2.8)
Top Overlay:
  lines w0.2: -25.7,-4.2 -30.3,-4.2 -30.3,4.3 -25.2,4.3 ; 25.2,-4 30.3,-4 30.3,4.3 25.2,4.3
M3 Top Assy:
  drawing of 219 lines, arcs and shapes, not listed
M8 Top Brd Anno:
  lines w0.1: -0.6,0 0.6,0 ; 0,-0.6 0,0.6 ; -30.6,-4.9 -30.6,4.8 30.5,4.8 30.5,-4.9 -30.6,-4.9
3D body "m80-4125042_asm.stp": height 5.6, standoff 0, extent -30,-3.748 30,3.748